# Altium footprint library 杂项开关等.PcbLib: 45 footprints (part 3 of 3)
Each footprint in its own frame and in the unit in brackets; x right, y up, seen from the top. Pads: shape width x height; smd on the part's side, far side on the other; paste and mask are expansions set on the pad; w line width, h text height; cw(c..) or ccw(c..) is an arc to the next point about the centre after c.
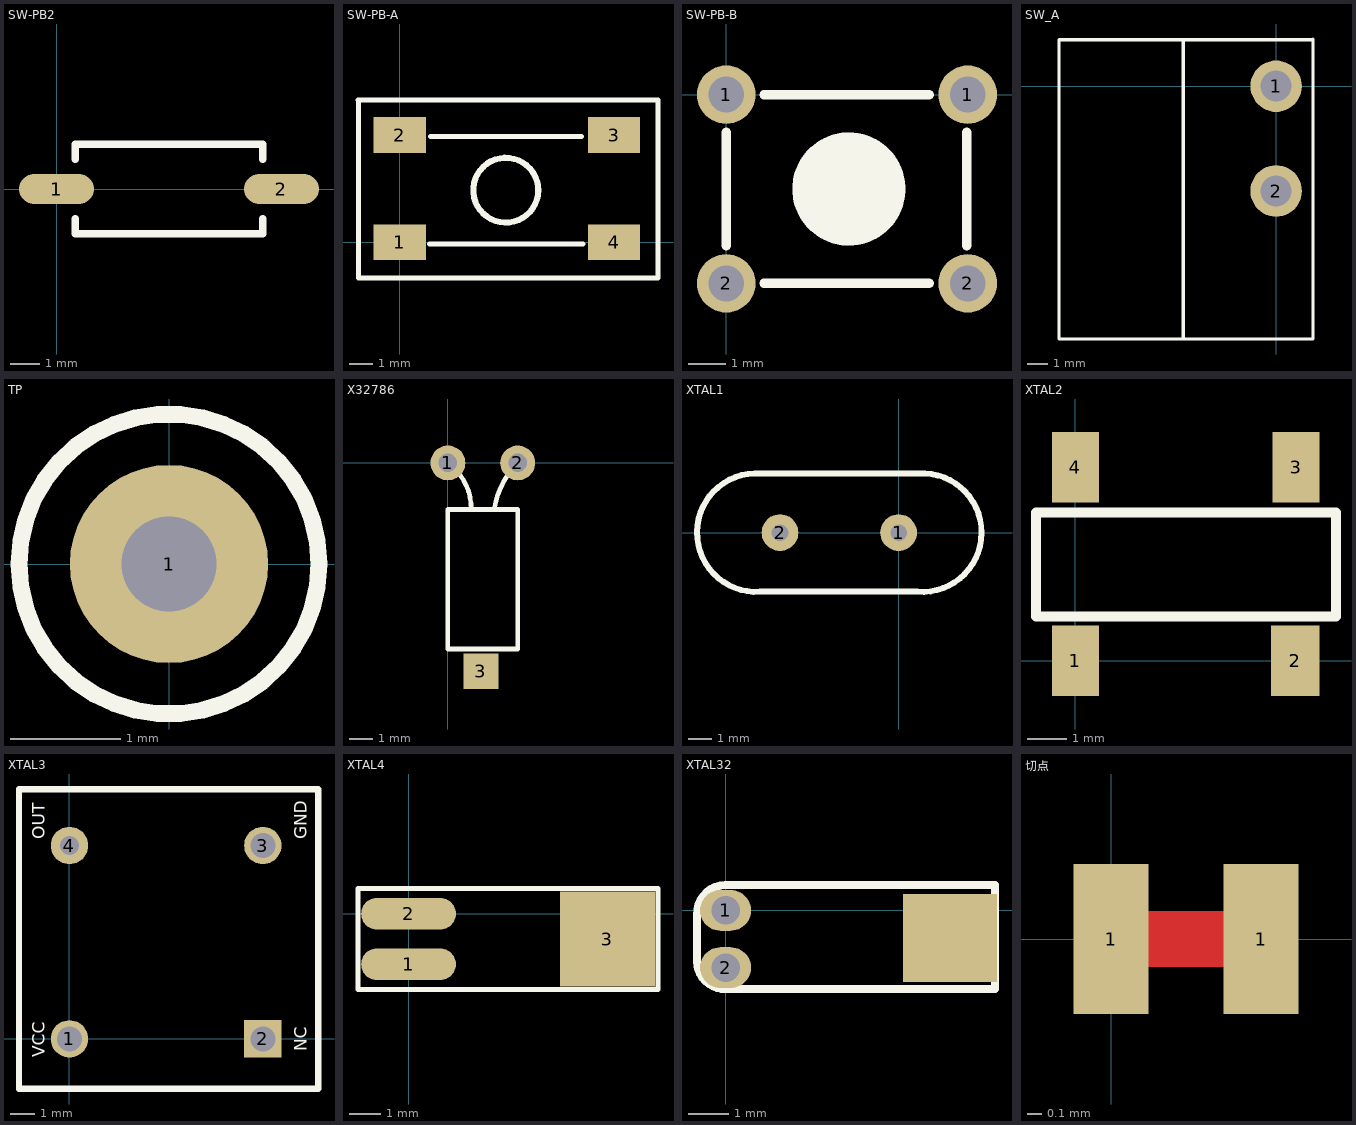
[diagram p2: the footprints below, top view; thin cyan lines are the x and y axes]

## SW-PB2 [mil]
pads (2):
  oval 100x40 smd: 1(0,0) 2(300,0)
Top Overlay:
  lines w10: 25,-40 25,-60 275,-60 275,-40 ; 25,40 25,60 275,60 275,40

## SW-PB-A [mm]
pads (4):
  rect 2.2x1.5 smd: 1(0,0) 2(0,4.5) 3(9,4.5) 4(9,0)
Top Overlay:
  circle w0.254: c4.453,2.184 r1.363
  lines w0.2: 1.245,-0.076 7.696,-0.076 ; 1.295,4.445 7.645,4.445 ; -1.753,5.969 10.846,5.969 10.846,-1.499 -1.727,-1.499 -1.727,5.74 -1.727,5.944 -1.753,5.969

## SW-PB-B [mil]
pads (4):
  round 62 hole 38: 1(0,0) 1(255.91,0) 2(0,-200) 2(255.91,-200)
Top Overlay:
  circle w60: c130,-100 r30
  lines w10: -0.03,-160 -0.03,-40 ; 39.97,-200 215,-200 ; 39.97,0 215,0 ; 255,-160 255,-40

## SW_A [mm]
pads (2):
  round 2.5 hole 1.5: 1(0,0) 2(0,-5.08)
Top Overlay:
  lines w0.152: -4.5,-12.25 -4.5,2.25 ; 1.778,-12.25 -10.512,-12.25 -10.512,2.25 1.778,2.25 ; 1.778,-12.214 1.778,2.286

## TP [mm]
pads (1):
  round 1.8 hole 0.86: 1(0,0)
Top Overlay:
  circle w0.152: c0,0 r1.362

## X32786 [mm]
pads (3):
  round 1.5 hole 0.8: 1(0,0) 2(3,0)
  rect 1.524x1.524 smd: 3(1.422,-8.966)
Top Overlay:
  lines w0.2: 0,0 cw(c-1.433,-1.967) 1,-2 ; 2,-2 cw(c5.5,-2.5) 3,0 ; 0,-8 3,-8 3,-2 0,-2 0,-8

## XTAL1 [mil]
pads (2):
  round 62 hole 28: 1(0,0) 2(-200,0)
Top Overlay:
  lines w10: -232.03,99.68 ccw(c-240,0) -233.56,-99.79 -233.45,-99.68 32.02,-99.68 ; 32.03,-99.68 ccw(c40,0) 33.56,99.79 -231.91,99.79 ; -231.91,99.79 -232.03,99.68 -231.91,99.79

## XTAL2 [mil]
pads (4):
  rect 47.24x70 smd: 1(0,0) 3(220,193) 4(0,193)
  rect 48.42x70 smd: 2(219,0)
Top Overlay:
  lines w10: -39.37,44 -39.37,148 259.84,148 259.84,44 -39.37,44

## XTAL3 [mil]
pads (4):
  round 60 hole 40: 1(0,0) 3(310,310)
  rect 60x60 hole 40: 2(310.08,0.1)
  round 60 hole 30: 4(0,310)
Top Overlay:
  lines w10: -80.94,-79.9 -80.94,400.1 399.06,400.1 399.06,-79.9 -80.94,-79.9
  text "NC" at 380.08,-19.9 h20
  text "GND" at 380.08,320.1 h20
  text "OUT" at -39.92,320.1 h20
  text "VCC" at -39.92,-29.9 h20

## XTAL4 [mm]
pads (3):
  oval 3x1 smd: 1(0,-1.6) 2(0,0)
  rect 3x3 smd: 3(6.3,-0.8)
Top Overlay:
  lines w0.152: -1.6,-2.4 -1.6,0.8 7.9,0.8 7.9,-2.4 -1.6,-2.4

## XTAL32 [mil]
pads (3):
  oval 50x40 hole 28: 1(0,0) 2(0,-56)
  rect 92.13x86 smd: ""(220,-27)
Top Overlay:
  lines w8: -28,-50 ccw(c-0.5,-49.5) 0,-77 264,-77 264,25 0,25 ccw(c0.5,-3.5) -28,-4 -28,-50

## 切点 [mil]
pads (2):
  rect 20x40 smd: 1(0,0) 1(40,0)
Top Layer:
  lines w15: 0,0 40,0

## 船型开关弯针 [mm]